# Altium footprint library Libreria PCB.PcbLib: 75 footprints (part 1 of 5)
Each footprint in its own frame and in the unit in brackets; x right, y up, seen from the top. Pads: shape width x height; smd on the part's side, far side on the other; paste and mask are expansions set on the pad; w line width, h text height; cw(c..) or ccw(c..) is an arc to the next point about the centre after c.
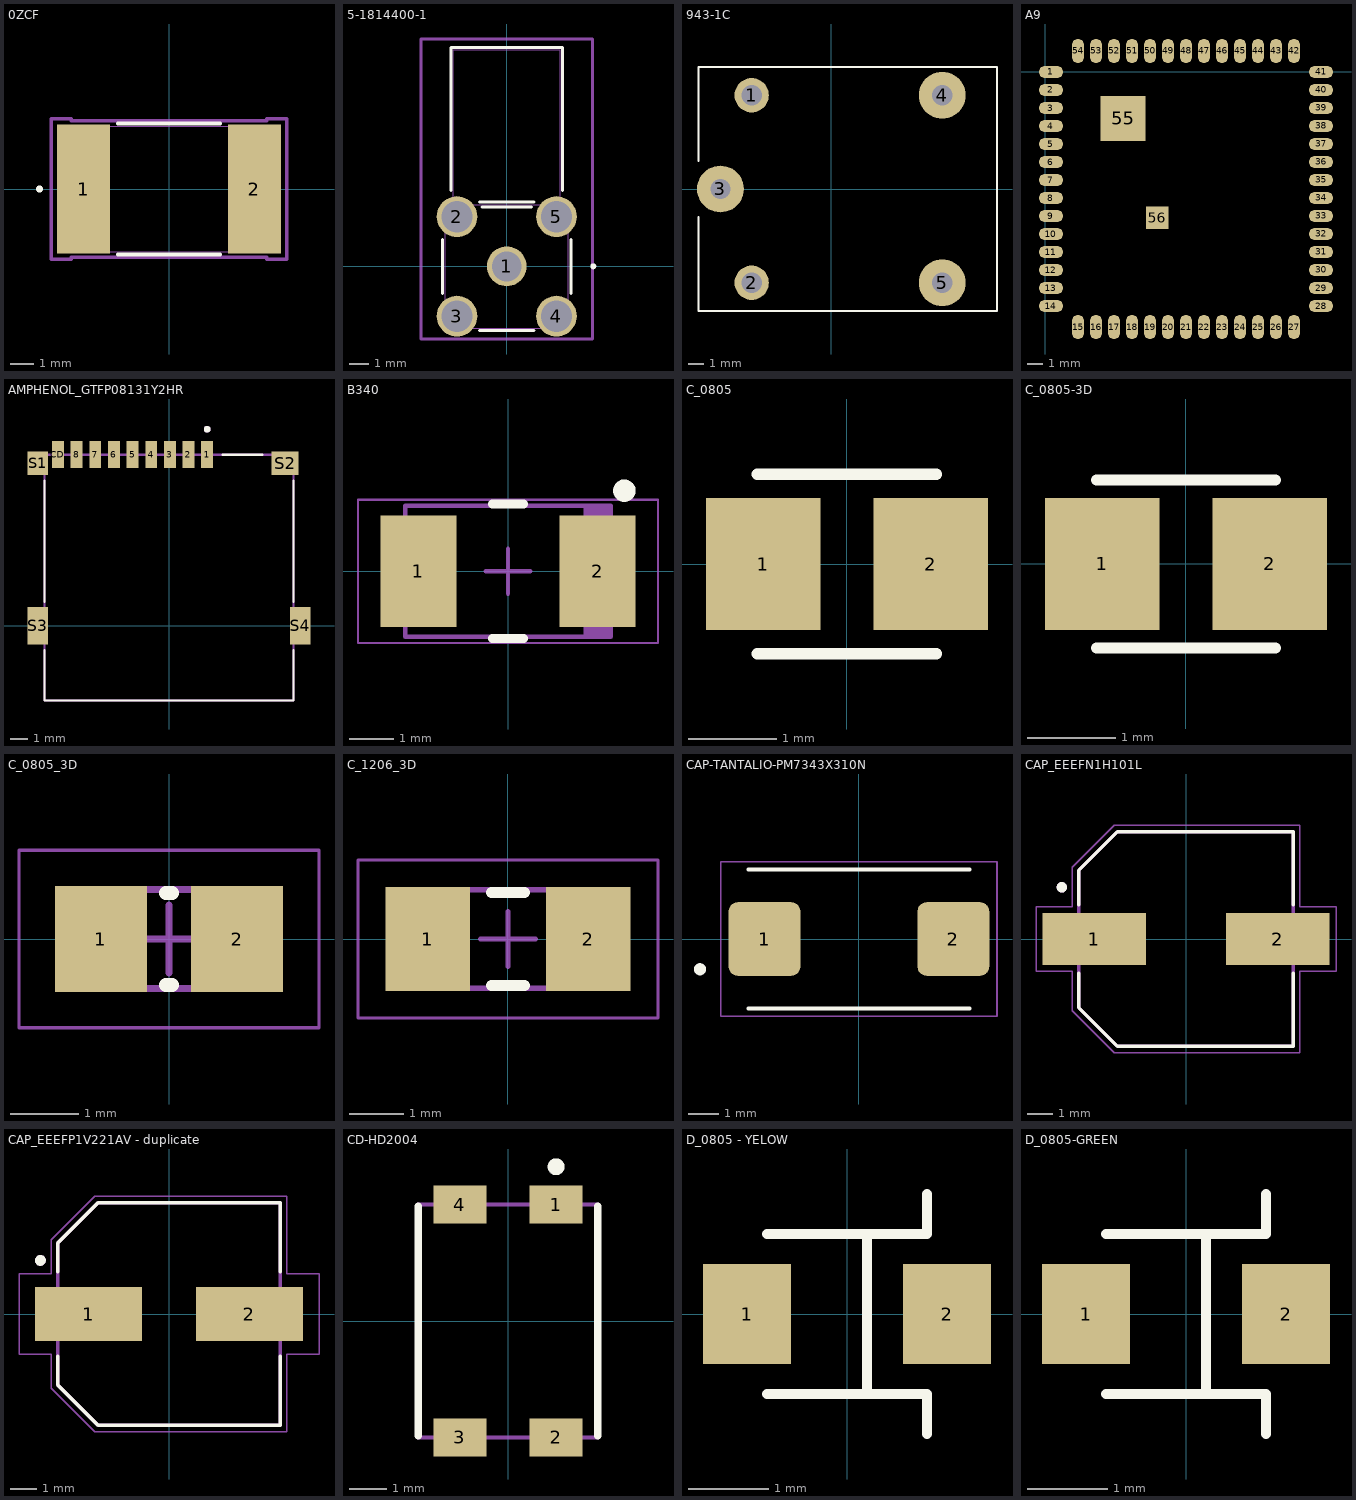
[diagram p0: the footprints below, top view; thin cyan lines are the x and y axes]

## 0ZCF [mil]
pads (2):
  rect 91x221 smd paste+0 mask+0: 1(-146,0) 2(146,0)
Top Overlay:
  circle w6: c-221.5,0 r3
  lines w6: -87.49,-112 87.49,-112 ; -87.49,112 87.49,112
Mechanical 13:
  circle w0: c-147,0 r3
  lines w1: -157,-107 -157,107 157,107 157,-107 -157,-107
Mechanical 15:
  lines w6: -201.5,-120.5 -167,-120.5 -167,-117 167,-117 167,-120.5 201.5,-120.5 201.5,120.5 167,120.5 167,117 -167,117 -167,120.5 -201.5,120.5 -201.5,-120.5
3D body "0ZCF.step": height 45, standoff 0, extent -157,-110.51 157.02,110.52

## 5-1814400-1 [mil]
pads (5):
  round 80 / inner round 60 / far side round 80 hole 60 paste+0 mask+0: 1(0,0)
  round 82 / inner round 60 / far side round 82 hole 63 paste+0 mask+0: 2(-100,100) 3(-100,-100) 4(100,-100) 5(100,100)
Top Overlay:
  circle w6: c174.02,0 r3
  lines w6: -129.02,-54.34 -129.02,54.34 ; -112.28,152.69 -112.28,440.04 112.28,440.04 112.28,152.69 ; -54.34,-129.02 54.34,-129.02 ; -54.34,129.02 54.34,129.02 ; -49.35,119.02 49.35,119.02 ; 129.02,-54.34 129.02,54.34
Mechanical 13:
  lines w1: -124.02,-124.02 -124.02,124.02 124.02,124.02 124.02,-124.02 -124.02,-124.02 ; -107.28,124.02 -107.28,435.04 107.28,435.04 107.28,124.02 -107.28,124.02
Mechanical 15:
  lines w6: -171.93,-146 171.93,-146 171.93,457.02 -171.93,457.02 -171.93,-146
3D body: height 10, standoff 0, extent 0,0 10,10
3D body "c-5-1814400-1-d-3d.stp": height 410.63, standoff -122.05, extent -124.55,-124.02 124.55,435.04

## 943-1C [mm]
pads (5):
  round 2.2 hole 1.3: 1(-5.1,6) 2(-5.1,-6)
  round 3 hole 1.3: 3(-7.1,0) 4(7.1,6) 5(7.1,-6)
Top Overlay:
  lines w0.127: -8.5,-1.8 -8.5,-7.8 10.6,-7.8 10.6,7.8 -8.5,7.8 -8.5,1.8
3D body: height 15.3, standoff 0, extent -8.5,-7.75 10.5,7.75

## A9 [mm]
pads (56):
  oval 1.6x0.8 smd: 1(0.4,0) 2(0.4,-1.2) 3(0.4,-2.4) 4(0.4,-3.6) 5(0.4,-4.8) 6(0.4,-6) 7(0.4,-7.2) 8(0.4,-8.4) 9(0.4,-9.6) 10(0.4,-10.8) 11(0.4,-12) 12(0.4,-13.2) 13(0.4,-14.4) 14(0.4,-15.6) 28(18.4,-15.6) 29(18.4,-14.4) 30(18.4,-13.2) 31(18.4,-12) 32(18.4,-10.8) 33(18.4,-9.6) 34(18.4,-8.4) 35(18.4,-7.2) 36(18.4,-6) 37(18.4,-4.8) 38(18.4,-3.6) 39(18.4,-2.4) 40(18.4,-1.2) 41(18.4,0)
  oval 0.8x1.6 smd: 15(2.2,-17) 16(3.4,-17) 17(4.6,-17) 18(5.8,-17) 19(7,-17) 20(8.2,-17) 21(9.4,-17) 22(10.6,-17) 23(11.8,-17) 24(13,-17) 25(14.2,-17) 26(15.4,-17) 27(16.6,-17) 42(16.6,1.4) 43(15.4,1.4) 44(14.2,1.4) 45(13,1.4) 46(11.8,1.4) 47(10.6,1.4) 48(9.4,1.4) 49(8.2,1.4) 50(7,1.4) 51(5.8,1.4) 52(4.6,1.4) 53(3.4,1.4) 54(2.2,1.4)
  rect 3x3 smd: 55(5.2,-3.1)
  rect 1.5x1.5 smd: 56(7.5,-9.7)
3D body "a9.step": height 1.8, standoff -0.16, extent 0,-17.4 18.8,1.8

## AMPHENOL_GTFP08131Y2HR [mm]
height 1.85
pads (13):
  rect 0.7x1.6 smd: 1(2.25,10.1) 2(1.15,10.1) 3(0.05,10.1) 4(-1.05,10.1) 5(-2.15,10.1) 6(-3.25,10.1) 7(-4.35,10.1) 8(-5.45,10.1) CD(-6.55,10.1)
  rect 1.2x1.4 smd: S1(-7.75,9.6)
  rect 1.6x1.4 smd: S2(6.85,9.6)
  rect 1.2x2.2 smd: S3(-7.75,0) S4(7.75,0)
Top Overlay:
  circle w0.2: c2.25,11.6 r0.1
  lines w0.127: -7.35,-1.42 -7.35,-4.4 7.35,-4.4 7.35,-1.42 ; -7.35,1.42 -7.35,8.58 ; 3.15,10.1 5.5,10.1 ; 7.35,1.42 7.35,8.58
Mechanical 13:
  circle w0.2: c2.25,11.6 r0.1
  lines w0.127: -7.35,-4.4 -7.35,10.1 7.35,10.1 7.35,-4.4 -7.35,-4.4
3D body "step_temp.STEP": height 1.9, standoff 0, extent -8.05,-4.4 8.05,10.6

## B340 [mm] "Molded Diode, 2-Leads, Body 4.60x2.92mm"
height 2.4
pads (2):
  rect 1.7x2.5 smd: 1(-2,0) 2(2,0)
Top Overlay:
  circle w0.25: c2.6,1.8 r0.125
  lines w0.2: -0.35,-1.5 0.35,-1.5 ; -0.35,1.5 0.35,1.5
Mechanical 13:
  rectangle: 1.681,-1.46 2.3,1.46
  lines w0.1: -2.3,-1.46 2.3,-1.46 2.3,1.46 -2.3,1.46 -2.3,-1.46
Mechanical 15:
  lines w0.05: -3.35,-1.6 3.35,-1.6 3.35,1.6 -3.35,1.6 -3.35,-1.6
  lines w0.1: -0.5,0 0.5,0 ; 0,-0.5 0,0.5
3D body "DIOM4326X24L.step": height 2.4, standoff 0, extent -2.52,-1.46 2.52,1.46

## C_0805 [mm] "Chip Capacitor 0805"
pads (2):
  rect 1.3x1.5 smd: 1(-0.95,0) 2(0.95,0)
Top Overlay:
  lines w0.127: -1.016,-1.016 1.016,-1.016 ; -1.016,1.016 1.016,1.016

## C_0805-3D [mm] "Chip Capacitor, 2-Leads, Body 2.00x1.25mm"
height 1.1
pads (2):
  rect 1.3x1.5 smd: 1(-0.95,0) 2(0.95,0)
Top Overlay:
  lines w0.127: -1.016,-0.953 1.016,-0.953 ; -1.016,0.953 1.016,0.953
3D body "SW3dPS-0805 SMD Capacitor.STEP": height 0.78, standoff 0, extent -1,-0.625 1,0.625

## C_0805_3D [mm] "Chip capacitor"
height 0.65
pads (2):
  rect 1.35x1.55 smd: 1(-1,0) 2(1,0)
Top Overlay:
  lines w0.2: -0.05,-0.675 0.05,-0.675 ; -0.05,0.675 0.05,0.675
Mechanical 13:
  lines w0.1: -1.1,-0.725 1.1,-0.725 1.1,0.725 -1.1,0.725 -1.1,-0.725
Mechanical 15:
  lines w0.05: -2.2,-1.3 2.2,-1.3 2.2,1.3 -2.2,1.3 -2.2,-1.3
  lines w0.1: -0.5,0 0.5,0 ; 0,-0.5 0,0.5
3D body: height 0.75, standoff 0, extent 0.6,-0.725 1.1,0.725
3D body: height 0.75, standoff 0, extent -1.1,-0.725 -0.6,0.725
3D body: height 0.75, standoff 0, extent -0.6,-0.725 0.6,0.725

## C_1206_3D [mm]
pads (2):
  rect 1.55x1.9 smd: 1(-1.475,0) 2(1.475,0)
Top Overlay:
  lines w0.2: -0.3,-0.85 0.3,-0.85 ; -0.3,0.85 0.3,0.85
Mechanical 13:
  lines w0.1: -1.7,-0.9 1.7,-0.9 1.7,0.9 -1.7,0.9 -1.7,-0.9
Mechanical 15:
  lines w0.05: -2.75,-1.45 2.75,-1.45 2.75,1.45 -2.75,1.45 -2.75,-1.45
  lines w0.1: -0.5,0 0.5,0 ; 0,-0.5 0,0.5
3D body "CAPC3216X18M.step": height 1.8, standoff 0, extent -1.7,-0.9 1.7,0.9

## CAP-TANTALIO-PM7343X310N [mm] "Capacitores de tantalio moldeado de 100 µF 10 V 2917 (7343 métrico) 600 mOhm"
pads (2):
  rrect25% 2.37x2.43 smd: 1(-3.12,0) 2(3.12,0)
Top Overlay:
  circle w0.2: c-5.25,-1 r0.1
  lines w0.127: -3.65,-2.3 3.65,-2.3 ; -3.65,2.3 3.65,2.3
Mechanical 15:
  lines w0.05: -4.56,-2.55 4.56,-2.55 4.56,2.55 -4.56,2.55 -4.56,-2.55
3D body "CAP_TANT_7343-31.STEP": height 3.1, standoff 0, extent -3.8,-2.3 3.8,2.3

## CAP_EEEFN1H101L [mm]
pads (2):
  rect 4x2 smd: 1(-3.55,0) 2(3.55,0)
Top Overlay:
  circle w0.2: c-4.8,2 r0.1
  lines w0.127: -4.15,-1.32 -4.15,-2.65 -2.65,-4.15 4.15,-4.15 4.15,-1.32 ; -4.15,1.32 -4.15,2.65 -2.65,4.15 4.15,4.15 4.15,1.32
Mechanical 13:
  circle w0.2: c-4.8,2 r0.1
  lines w0.127: -4.15,-2.65 -4.15,2.65 -2.65,4.15 4.15,4.15 4.15,-4.15 -2.65,-4.15 -4.15,-2.65
Mechanical 15:
  lines w0.05: -5.8,-1.25 -4.4,-1.25 -4.4,-2.775 -2.775,-4.4 4.4,-4.4 4.4,-1.25 5.8,-1.25 5.8,1.25 4.4,1.25 4.4,4.4 -2.775,4.4 -4.4,2.775 -4.4,1.25 -5.8,1.25 -5.8,-1.25
3D body "step_temp.STEP": height 10.2, standoff 0, extent -4.85,-4.15 4.85,4.15

## CAP_EEEFP1V221AV - duplicate [mm]
pads (2):
  rect 4x2 smd: 1(-3,0) 2(3,0)
Top Overlay:
  circle w0.2: c-4.8,2 r0.1
  lines w0.127: -4.15,-1.57 -4.15,-2.65 -2.65,-4.15 4.15,-4.15 4.15,-1.57 ; -4.15,1.57 -4.15,2.65 -2.65,4.15 4.15,4.15 4.15,1.57
Mechanical 13:
  circle w0.2: c-4.8,2 r0.1
  lines w0.127: -4.15,-2.65 -2.65,-4.15 4.15,-4.15 4.15,4.15 -2.65,4.15 -4.15,2.65 -4.15,-2.65
Mechanical 15:
  lines w0.05: -5.6,-1.5 -5.6,1.5 -4.4,1.5 -4.4,2.775 -2.775,4.4 4.4,4.4 4.4,1.5 5.6,1.5 5.6,-1.5 4.4,-1.5 4.4,-4.4 -2.775,-4.4 -4.4,-2.775 -4.4,-1.5 -5.6,-1.5
3D body "EEEFP1V221AV-CAP ALUM 220UF 20% 35V SMD.STEP": height 10.5, standoff 0, extent -4.85,-4.15 4.85,4.15

## CD-HD2004 [mm]
pads (4):
  rect 1.4x1 smd: 1(1.27,3.075) 2(1.27,-3.075) 3(-1.27,-3.075) 4(-1.27,3.075)
Top Overlay:
  circle w0.3: c1.27,4.075 r0.071
  lines w0.2: -2.375,-3.025 -2.375,3.025 ; 2.375,-3.025 2.375,3.025
Mechanical 13:
  lines w0.1: -2.375,-3.075 2.375,-3.075 2.375,3.075 -2.375,3.075 -2.375,-3.075
3D body: height 1.07, standoff 0, extent -2.375,-3.075 2.375,3.075

## D_0805 - YELOW [mm] "diodo led 0805"
pads (2):
  rect 1.1x1.25 smd: 1(-1.25,0) 2(1.25,0)
Top Overlay:
  lines w0.127: -1,-1 1,-1 1,-1.5 ; -1,1 1,1 1,1.5 ; 0.25,-1 0.25,1
3D body "led_0805 YEL.STEP": height 1.1, standoff 0, extent -1.01,-0.625 1.01,0.625

## D_0805-GREEN [mm] "diodo GREEN 0805 smd"
pads (2):
  rect 1.1x1.25 smd: 1(-1.25,0) 2(1.25,0)
Top Overlay:
  lines w0.127: -1,-1 1,-1 1,-1.5 ; -1,1 1,1 1,1.5 ; 0.25,-1 0.25,1
3D body "led_0805 GRE.STEP": height 1.1, standoff 0, extent -1.01,-0.625 1.01,0.625